# Altium footprint library WCAP-ATG8.PcbLib: 18 footprints (part 2 of 2)
Each footprint in its own frame and in the unit in brackets; x right, y up, seen from the top. Pads: shape width x height; smd on the part's side, far side on the other; paste and mask are expansions set on the pad; w line width, h text height; cw(c..) or ccw(c..) is an arc to the next point about the centre after c.
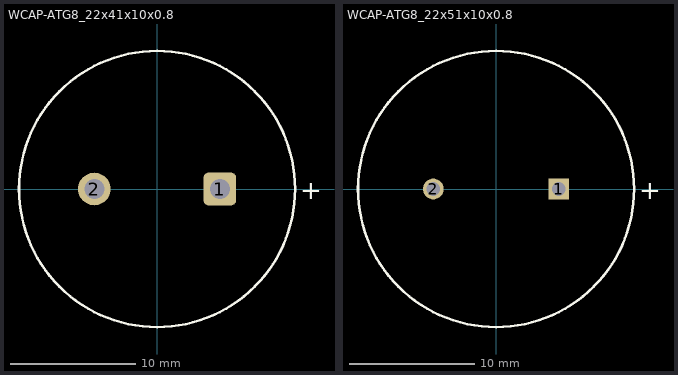
[diagram p1: the footprints below, top view; thin cyan lines are the x and y axes]

## WCAP-ATG8_22x41x10x0.8 [mm] "Polarized capacitors, Aluminum Electrolytic Capacitors, 2-Leads, Body 22x41x10x0.8"
height 41
pads (2):
  rrect30% 2.6x2.6 hole 1.6: 1(5,0)
  round 2.6 hole 1.6: 2(-5,0)
Top Overlay:
  circle w0.2: c0,0 r11
  text "+" at 11.4,-0.8 h1.5
3D body "22x41x10x0.8.stp": height 41.11, standoff -20.11, extent -10.99,-11 10.909,10.941

## WCAP-ATG8_22x51x10x0.8 [mm] "Polarized capacitors, Aluminum Electrolytic Capacitors, 2-Leads, Body 22x51x10x0.8"
height 51
pads (2):
  rect 1.65x1.65 hole 1.1: 1(5,0)
  round 1.65 hole 1.1: 2(-5,0)
Top Overlay:
  circle w0.2: c0,0 r11
  text "+" at 11.4,-0.8 h1.5
3D body "22x51x10x0.8.stp": height 51.11, standoff -20.11, extent -10.99,-10.984 10.909,10.941